# Altium footprint library footprints.PcbLib: 178 footprints (part 12 of 12)
Each footprint in its own frame and in the unit in brackets; x right, y up, seen from the top. Pads: shape width x height; smd on the part's side, far side on the other; paste and mask are expansions set on the pad; w line width, h text height; cw(c..) or ccw(c..) is an arc to the next point about the centre after c.
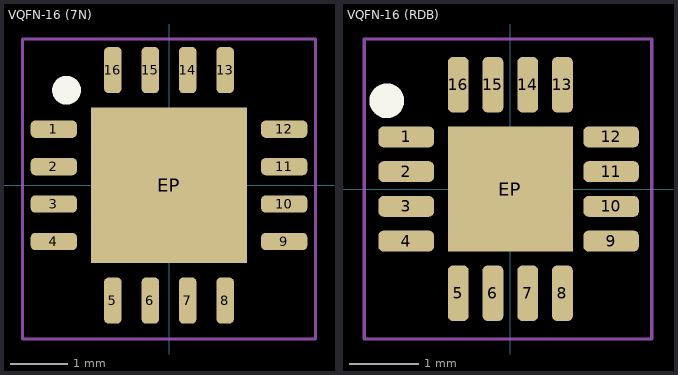
[diagram p11: the footprints below, top view; thin cyan lines are the x and y axes]

## VQFN-16 (7N) [mm] "16-Lead Plastic Quad Flat, No Lead Package (7N) - 4x4x1.0 mm Body [VQFN]  Wettable Flanks (Stepped), 0.40 mm Terminal Length"
pads (17):
  rrect50% 0.8x0.3 smd: 1(-2,0.975) 2(-2,0.325) 3(-2,-0.325) 4(-2,-0.975) 9(2,-0.975) 10(2,-0.325) 11(2,0.325) 12(2,0.975)
  rrect50% 0.3x0.8 smd: 5(-0.975,-2) 6(-0.325,-2) 7(0.325,-2) 8(0.975,-2) 13(0.975,2) 14(0.325,2) 15(-0.325,2) 16(-0.975,2)
  rect 2.7x2.7 smd: EP(0,0)
Top Overlay:
  circle w0.25: c-1.778,1.651 r0.125
Mechanical 15:
  lines w0.05: -2.54,-2.667 -2.54,2.54 2.54,2.54 2.54,-2.667 -2.54,-2.667

## VQFN-16 (RDB) [mm] "16-Lead Very Thin Plastic Quad Flat, No Lead Package (RDB) - 3x3x0.9 mm Body [VQFN]  With 1.7 mm Exposed Pad; Atmel Legacy Package ZPX"
pads (17):
  rrect50% 0.8x0.3 smd: 1(-1.5,0.75) 2(-1.5,0.25) 3(-1.5,-0.25) 4(-1.5,-0.75) 9(1.45,-0.75) 10(1.45,-0.25) 11(1.45,0.25) 12(1.45,0.75)
  rrect50% 0.3x0.8 smd: 5(-0.75,-1.5) 6(-0.25,-1.5) 7(0.25,-1.5) 8(0.75,-1.5) 13(0.75,1.5) 14(0.25,1.5) 15(-0.25,1.5) 16(-0.75,1.5)
  rect 1.8x1.8 smd: EP(0,0)
Top Overlay:
  circle w0.25: c-1.778,1.27 r0.125
Mechanical 15:
  lines w0.05: -2.1,-2.159 2.032,-2.159 2.032,2.159 -2.1,2.159 -2.1,-2.159
3D body "VQFN-16 (RDB).STEP": height 0.97, standoff 0, extent -1.51,-1.51 1.51,1.51